# Altium footprint library CONECTER.PcbLib: 120 footprints (part 5 of 8)
Each footprint in its own frame and in the unit in brackets; x right, y up, seen from the top. Pads: shape width x height; smd on the part's side, far side on the other; paste and mask are expansions set on the pad; w line width, h text height; cw(c..) or ccw(c..) is an arc to the next point about the centre after c.
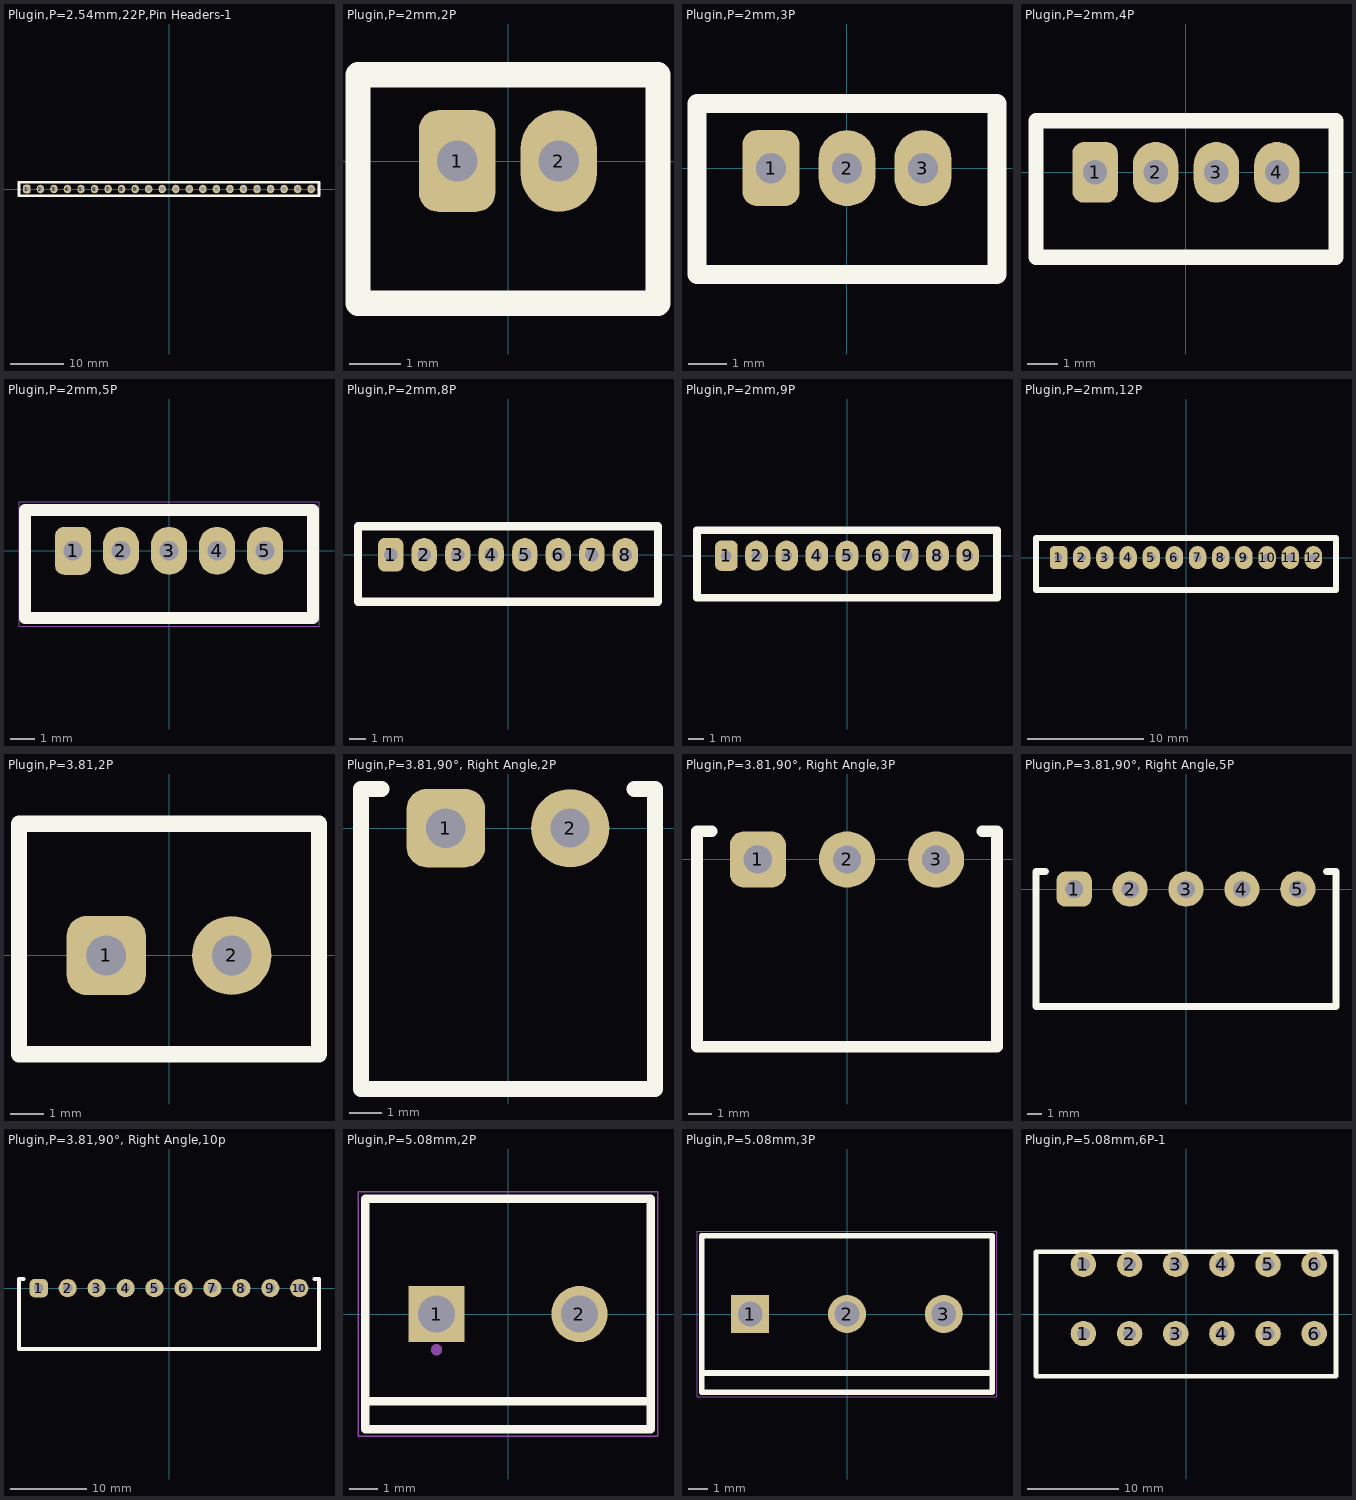
[diagram p4: the footprints below, top view; thin cyan lines are the x and y axes]

## Plugin,P=2.54mm,22P,Pin Headers-1 [mm]
pads (22):
  rrect50% 1.4x1.6 hole 0.8 mask+0.15: 1(-26.67,0)
  oval 1.4x1.6 hole 0.8 mask+0.15: 2(-24.13,0) 3(-21.59,0) 4(-19.05,0) 5(-16.51,0) 6(-13.97,0) 7(-11.43,0) 8(-8.89,0) 9(-6.35,0) 10(-3.81,0) 11(-1.27,0) 12(1.27,0) 13(3.81,0) 14(6.35,0) 15(8.89,0) 16(11.43,0) 17(13.97,0) 18(16.51,0) 19(19.05,0) 20(21.59,0) 21(24.13,0) 22(26.67,0)
Top Overlay:
  lines w0.5: -28.14,-1.25 28.14,-1.25 28.14,1.25 -28.14,1.25 -28.14,-1.25
3D body "68655-422HLF.STEP": height 10.61, standoff -7.37, extent -27.94,-1.205 27.94,1.205

## Plugin,P=2mm,2P [mm]
pads (2):
  rrect50% 1.5x2 hole 0.8 mask+0.15: 1(-1,0)
  oval 1.5x2 hole 0.8 mask+0.15: 2(1,0)
Top Overlay:
  lines w0.5: -2.95,-2.8 2.95,-2.8 2.95,1.7 -2.95,1.7 -2.95,-2.8
3D body "B2B-PH-K-S.stp": height 6, standoff -3.4, extent -2.95,-2.8 2.95,1.7

## Plugin,P=2mm,3P [mm]
pads (3):
  rrect50% 1.5x2 hole 0.8 mask+0.15: 1(-2,0)
  oval 1.5x2 hole 0.8 mask+0.15: 2(0,0) 3(2,0)
Top Overlay:
  lines w0.5: -3.95,-2.8 3.95,-2.8 3.95,1.7 -3.95,1.7 -3.95,-2.8
3D body "B3B-PH-K-S.stp": height 6, standoff -3.4, extent -3.95,-2.8 3.95,1.7

## Plugin,P=2mm,4P [mm]
pads (4):
  rrect50% 1.5x2 hole 0.8 mask+0.15: 1(-3,0)
  oval 1.5x2 hole 0.8 mask+0.15: 2(-1,0) 3(1,0) 4(3,0)
Top Overlay:
  lines w0.5: -4.95,-2.8 4.95,-2.8 4.95,1.7 -4.95,1.7 -4.95,-2.8
3D body "B4B-PH-K-S.stp": height 6, standoff -3.4, extent -4.95,-2.8 4.95,1.7

## Plugin,P=2mm,5P [mm]
pads (5):
  rrect50% 1.5x2 hole 0.8 mask+0.15: 1(-4,0)
  oval 1.5x2 hole 0.8 mask+0.15: 2(-2,0) 3(0,0) 4(2,0) 5(4,0)
Top Overlay:
  lines w0.5: -6,-2.8 -6,1.7 6,1.7 6,-2.8 -6,-2.8
3D:
  lines w0.127: -6,-2.9 -6,1.8 ; -6,-2.9 6,-2.9 ; -6,-2.9 -6,1.8 ; -6,-2.9 6,-2.9 ; -6,1.8 6,1.8 ; 6,-2.9 6,1.8 ; 6,-2.9 6,1.8
Mechanical 15:
  lines w0.05: -6.25,-3.15 -6.25,2.05 6.25,2.05 6.25,-3.15 -6.25,-3.15
3D body "B5B-PH-K-S.stp": height 6, standoff -3.4, extent -5.95,-2.8 5.95,1.7

## Plugin,P=2mm,8P [mm]
pads (8):
  rrect50% 1.5x2 hole 0.8 mask+0.15: 1(-7,0)
  oval 1.5x2 hole 0.8 mask+0.15: 2(-5,0) 3(-3,0) 4(-1,0) 5(1,0) 6(3,0) 7(5,0) 8(7,0)
Top Overlay:
  lines w0.5: -8.95,-2.8 8.95,-2.8 8.95,1.7 -8.95,1.7 -8.95,-2.8
3D body "B8B-PH-K-S.stp": height 6, standoff -3.4, extent -8.95,-2.8 8.95,1.7

## Plugin,P=2mm,9P [mm]
pads (9):
  rrect50% 1.5x2 hole 0.7 mask+0.15: 1(-8,0)
  oval 1.5x2 hole 0.7 mask+0.15: 2(-6,0) 3(-4,0) 4(-2,0) 5(0,0) 6(2,0) 7(4,0) 8(6,0) 9(8,0)
Top Overlay:
  lines w0.5: -9.95,-2.8 9.95,-2.8 9.95,1.7 -9.95,1.7 -9.95,-2.8
3D body "JST-B9B-PH-K-S.STEP": height 6, standoff -3.4, extent -9.95,-2.8 9.95,1.7

## Plugin,P=2mm,12P [mm]
pads (12):
  rrect50% 1.5x2 hole 0.7 mask+0.15: 1(-11,0)
  oval 1.5x2 hole 0.7 mask+0.15: 2(-9,0) 3(-7,0) 4(-5,0) 5(-3,0) 6(-1,0) 7(1,0) 8(3,0) 9(5,0) 10(7,0) 11(9,0) 12(11,0)
Top Overlay:
  lines w0.5: -12.95,-2.8 12.95,-2.8 12.95,1.7 -12.95,1.7 -12.95,-2.8

## Plugin,P=3.81,2P [mm]
pads (2):
  rrect50% 2.4x2.4 hole 1.2 mask+0.2: 1(-1.905,0)
  round 2.4 hole 1.2 mask+0.2: 2(1.905,0)
Top Overlay:
  lines w0.5: -4.55,-3 -4.55,4 4.55,4 4.55,-3 -4.55,-3
3D body "15EDGVC-3.81-02P-14-00AH.STEP": height 9.2, standoff -3.4, extent -4.205,-3.2 4.205,4

## Plugin,P=3.81,90°, Right Angle,2P [mm]
pads (2):
  rrect50% 2.4x2.4 hole 1.2 mask+0.2: 1(-1.905,0)
  round 2.4 hole 1.2 mask+0.2: 2(1.905,0)
Top Overlay:
  lines w0.5: -3.88,1.2 -4.505,1.2 -4.505,-8 4.505,-8 4.505,1.2 3.88,1.2
3D body "15EDGRC-3.81-02P-14-00AH.STEP": height 7.2, standoff -3.4, extent -4.21,-8 4.2,1.2

## Plugin,P=3.81,90°, Right Angle,3P [mm]
pads (3):
  rrect50% 2.4x2.4 hole 1.2 mask+0.2: 1(-3.81,0)
  round 2.4 hole 1.2 mask+0.2: 2(0,0) 3(3.81,0)
Top Overlay:
  lines w0.5: -5.785,1.2 -6.41,1.2 -6.41,-8 6.41,-8 6.41,1.2 5.785,1.2
3D body "15EDGRC-3.81-03P-14-00AH.STEP": height 7.2, standoff -3.4, extent -5.98,-8 6.24,1.2

## Plugin,P=3.81,90°, Right Angle,5P [mm]
pads (5):
  rrect50% 2.4x2.4 hole 1.2 mask+0.2: 1(-7.62,0)
  round 2.4 hole 1.2 mask+0.2: 2(-3.81,0) 3(0,0) 4(3.81,0) 5(7.62,0)
Top Overlay:
  lines w0.5: -9.595,1.2 -10.22,1.2 -10.22,-8 10.22,-8 10.22,1.2 9.595,1.2
3D body "15EDGRC-3.81-05P-14-00AH.STEP": height 7.2, standoff -3.4, extent -9.92,-8 9.92,1.2

## Plugin,P=3.81,90°, Right Angle,10p [mm]
pads (10):
  rrect50% 2.4x2.4 hole 1.2 mask+0.2: 1(-17.145,0)
  round 2.4 hole 1.2 mask+0.2: 2(-13.335,0) 3(-9.525,0) 4(-5.715,0) 5(-1.905,0) 6(1.905,0) 7(5.715,0) 8(9.525,0) 9(13.335,0) 10(17.145,0)
Top Overlay:
  lines w0.5: -19.12,1.2 -19.745,1.2 -19.745,-8 19.745,-8 19.745,1.2 19.12,1.2
3D body "15EDGRC-3.81-10P-14-00AH.STEP": height 7.2, standoff -3.4, extent -19.39,-8 19.5,1.2

## Plugin,P=5.08mm,2P [mm]
pads (2):
  rect 2x2 hole 1.3: 1(-2.54,0)
  round 2 hole 1.3: 2(2.54,0)
Top Overlay:
  lines w0.3: -5.08,-3.1 5.08,-3.1 ; -5.08,-3.1 -5.08,4.1 5.08,4.1 5.08,-3.1 ; -5.08,-3.1 -5.08,-4.1 5.08,-4.1 5.08,-3.1
3D:
  circle w0.2: c-2.54,-1.27 r0.1
  lines w0.127: -5.08,-4.1 5.08,-4.1 5.08,4.1 -5.08,4.1 -5.08,-4.1
Mechanical 15:
  lines w0.05: -5.33,-4.35 5.33,-4.35 5.33,4.35 -5.33,4.35 -5.33,-4.35
3D body "step_temp.STEP": height 10, standoff -3.5, extent -5.68,-4.1 5.08,4.1

## Plugin,P=5.08mm,3P [mm]
pads (3):
  rect 2x2 hole 1.3: 1(-5.08,0)
  round 2 hole 1.3: 2(0,0) 3(5.08,0)
Top Overlay:
  lines w0.3: -7.6,-3.1 7.55,-3.1 ; -7.62,-4.1 7.62,-4.1 7.62,4.1 -7.62,4.1 -7.62,-4.1
3D:
  lines w0.127: -7.62,-4.1 -7.62,4.1 7.62,4.1 7.62,-4.1 -7.62,-4.1
Mechanical 15:
  lines w0.05: -7.87,-4.35 7.87,-4.35 7.87,4.35 -7.87,4.35 -7.87,-4.35
3D body "282837-3.step": height 10.25, standoff -3.25, extent -8.22,-4 7.62,4.2

## Plugin,P=5.08mm,6P-1 [mm]
pads (12):
  round 2.8 hole 1.4: 1(-11.29,-2.15) 1(-11.29,5.47) 2(-6.21,-2.15) 2(-6.21,5.47) 3(-1.13,-2.15) 3(-1.13,5.47) 4(3.95,-2.15) 4(3.95,5.47) 5(9.03,-2.15) 5(9.03,5.47) 6(14.11,-2.15) 6(14.11,5.47)
Top Overlay:
  lines w0.5: 16.453,-6.85 -16.51,-6.85 -16.51,6.85 16.51,6.85 16.51,-6.85